# Altium footprint library Keyboard_parts.PcbLib: 52 footprints (part 2 of 4)
Each footprint in its own frame and in the unit in brackets; x right, y up, seen from the top. Pads: shape width x height; smd on the part's side, far side on the other; paste and mask are expansions set on the pad; w line width, h text height; cw(c..) or ccw(c..) is an arc to the next point about the centre after c.
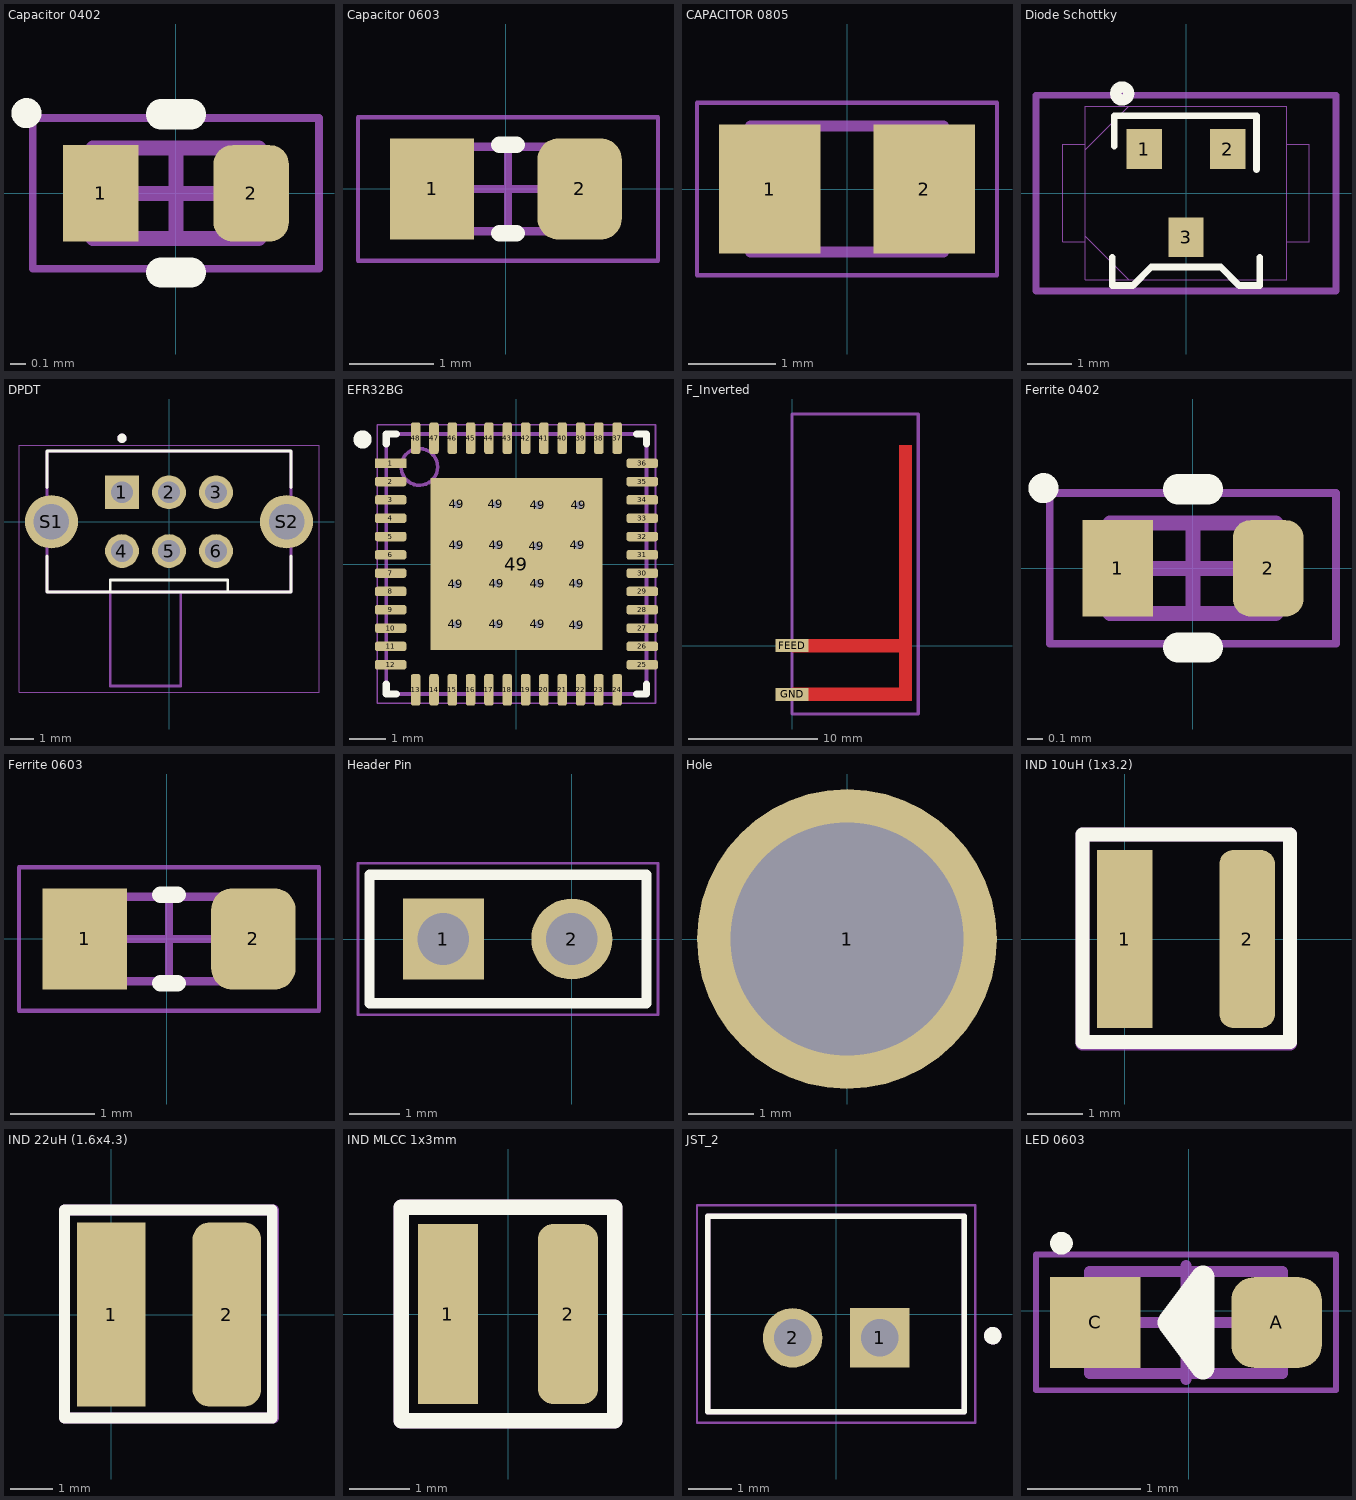
[diagram p1: the footprints below, top view; thin cyan lines are the x and y axes]

## Capacitor 0402 [mm]
height 0.55
pads (2):
  rect 0.5x0.64 smd: 1(-0.5,0)
  rrect50% 0.5x0.64 smd: 2(0.5,0)
Top Overlay:
  circle w0.1: c-0.992,0.532 r0.05
  lines w0.2: -0.1,-0.525 0.1,-0.525 ; -0.1,0.525 0.1,0.525
Mechanical 13:
  lines w0.1: -0.55,-0.3 -0.55,0.3 0.55,0.3 0.55,-0.3 -0.55,-0.3
  text ".Designator" at -0.55,-0.3 h0.4
Mechanical 15:
  lines w0.05: -0.95,-0.5 -0.95,0.5 0.95,0.5 0.95,-0.5 -0.95,-0.5
  lines w0.1: -0.3,0 0.3,0 ; 0,-0.3 0,0.3
3D body "step_temp.STEP": height 0.55, standoff 0, extent -0.5,-0.25 0.5,0.25

## Capacitor 0603 [mm] "Chip Capacitor, 2-Leads, Body 1.60x0.80mm, IPC Medium Density"
height 0.55
pads (2):
  rect 1x1.2 smd: 1(-0.875,0)
  rrect50% 1x1.2 smd: 2(0.875,0)
Top Overlay:
  lines w0.2: -0.075,-0.525 0.125,-0.525 ; -0.075,0.525 0.125,0.525
Mechanical 13:
  lines w0.1: -0.875,-0.5 0.925,-0.5 0.925,0.5 -0.875,0.5 -0.875,-0.5
  text ".Designator" at -0.875,-0.5 h0.4
Mechanical 15:
  lines w0.05: -1.753,-0.85 1.803,-0.85 1.803,0.85 -1.753,0.85 -1.753,-0.85
  lines w0.1: -0.475,0 0.525,0 ; 0.025,-0.5 0.025,0.5
3D body "CAP_0603_1608X10.step": height 1, standoff 0, extent -0.875,-0.5 0.925,0.5

## CAPACITOR 0805 [mm]
pads (2):
  rect 1.16x1.47 smd: 1(-0.88,0) 2(0.88,0)
Mechanical 13:
  lines w0.127: -1.1,-0.72 -1.1,0.72 1.1,0.72 1.1,-0.72 -1.1,-0.72
Mechanical 15:
  lines w0.05: -1.713,-0.983 -1.713,0.983 1.713,0.983 1.713,-0.983 -1.713,-0.983

## Diode Schottky [mm]
pads (3):
  rect 0.8x0.9 smd paste+0: 1(-0.95,1) 2(0.95,1)
  rect 0.8x0.9 smd: 3(0,-1)
Top Overlay:
  circle w0.254: c-1.448,2.261 r0.148
  lines w0.152: -1.676,-1.463 -1.676,-2.095 -1.206,-2.095 -0.787,-1.676 0.787,-1.676 1.206,-2.095 1.676,-2.095 1.676,-1.463 ; -1.626,1.067 -1.626,1.753 1.6,1.753 1.6,0.533
Mechanical 13:
  lines w0.025: -2.286,-0.984 -1.302,-1.968 ; -2.286,0.984 -1.302,1.968 ; -2.794,-1.105 -2.286,-1.105 -2.286,1.105 -2.794,1.105 -2.794,-1.105 ; -2.286,-1.968 -2.286,1.968 2.286,1.968 2.286,-1.968 -2.286,-1.968 ; 2.286,-1.105 2.794,-1.105 2.794,1.105 2.286,1.105 2.286,-1.105
Mechanical 15:
  lines w0.152: -3.404,-2.222 3.404,-2.222 3.404,2.222 -3.404,2.222 -3.404,-2.222
3D body "LSM115JE3_TR13.step": height 2.81, standoff -0.49, extent -2.675,-1.785 2.725,1.835

## DPDT [mm]
height 5
pads (8):
  rect 1.438x1.438 / inner round 1.438 / far side rect 1.438x1.438 hole 0.93: 1(-2,1.25)
  round 1.438 hole 0.93: 2(0,1.25) 3(2,1.25) 4(-2,-1.25) 5(0,-1.25) 6(2,-1.25)
  round 2.265 hole 1.51: S1(-5,0) S2(5,0)
Top Overlay:
  circle w0.2: c-2,3.55 r0.1
  lines w0.127: -5.2,-1.452 -5.2,-3 -2.5,-3 ; -5.2,1.452 -5.2,3 5.2,3 5.2,1.452 ; 5.2,-1.452 5.2,-3 2.5,-3 ; -2.5,-3 -2.5,-2.489 2.5,-2.489 2.5,-3 ; -2.5,-3 2.5,-3
Mechanical 13:
  circle w0.2: c-2,3.55 r0.1
  lines w0.127: -2.5,-3 -2.5,-7 0.5,-7 0.5,-3 ; -2.5,-3 0.5,-3 ; -2.5,-3 -5.2,-3 -5.2,3 5.2,3 5.2,-3 0.5,-3
Mechanical 15:
  lines w0.05: -6.382,-7.25 6.382,-7.25 6.382,3.25 -6.382,3.25 -6.382,-7.25
3D body "step_temp.STEP": height 5, standoff -3, extent -5.15,-7 5.15,3

## EFR32BG [mm] "PQFN, 48-Leads, Body 7.00x7.00mm, Pitch 0.50mm, Thermal Pad 4.70x4.70mm, IPC Medium Density"
height 0.9
pads (65):
  rect 0.86x0.26 smd mask+0.05: 1(-3.435,2.75)
  rrect50% 0.86x0.26 smd mask+0.05: 2(-3.435,2.25) 3(-3.435,1.75) 4(-3.435,1.25) 5(-3.435,0.75) 6(-3.435,0.25) 7(-3.435,-0.25) 8(-3.435,-0.75) 9(-3.435,-1.25) 10(-3.435,-1.75) 11(-3.435,-2.25) 12(-3.435,-2.75) 25(3.435,-2.75) 26(3.435,-2.25) 27(3.435,-1.75) 28(3.435,-1.25) 29(3.435,-0.75) 30(3.435,-0.25) 31(3.435,0.25) 32(3.435,0.75) 33(3.435,1.25) 34(3.435,1.75) 35(3.435,2.25) 36(3.435,2.75)
  rrect50% 0.26x0.86 smd mask+0.05: 13(-2.75,-3.435) 14(-2.25,-3.435) 15(-1.75,-3.435) 16(-1.25,-3.435) 17(-0.75,-3.435) 18(-0.25,-3.435) 19(0.25,-3.435) 20(0.75,-3.435) 21(1.25,-3.435) 22(1.75,-3.435) 23(2.25,-3.435) 24(2.75,-3.435) 37(2.75,3.435) 38(2.25,3.435) 39(1.75,3.435) 40(1.25,3.435) 41(0.75,3.435) 42(0.25,3.435) 43(-0.25,3.435) 44(-0.75,3.435) 45(-1.25,3.435) 46(-1.75,3.435) 47(-2.25,3.435) 48(-2.75,3.435)
  round 0.5 hole 0.2: 49(-1.651,-1.651) 49(-1.651,-0.559) 49(-1.626,0.508) 49(-1.626,1.626) 49(-0.559,1.626) 49(-0.533,-1.651) 49(-0.533,-0.533) 49(-0.533,0.508) 49(0.559,0.483) 49(0.584,-1.651) 49(0.584,-0.533) 49(0.584,1.6) 49(1.651,-1.676) 49(1.651,-0.533) 49(1.676,0.508) 49(1.702,1.6)
  rect 4.7x4.7 smd paste-20 mask+0.05: 49(0,0)
Top Overlay:
  circle w0.25: c-4.2,3.4 r0.125
  lines w0.2: -3.55,-3.28 -3.55,-3.55 -3.28,-3.55 ; -3.55,3.28 -3.55,3.55 -3.28,3.55 ; 3.28,-3.55 3.55,-3.55 3.55,-3.28 ; 3.28,3.55 3.55,3.55 3.55,3.28
Top Paste:
  rectangle: 0.686,-1.473 1.448,-0.762
  rectangle: -0.381,-1.473 0.381,-0.762
  rectangle: -1.473,-1.473 -0.711,-0.762
  rectangle: 0.711,-0.356 1.473,0.356
  rectangle: -0.381,-0.356 0.381,0.356
  rectangle: -1.473,-0.356 -0.711,0.356
  rectangle: 0.711,0.737 1.473,1.448
  rectangle: -0.381,0.737 0.381,1.448
  rectangle: -1.499,0.737 -0.737,1.448
Mechanical 13:
  circle w0.1: c-2.65,2.65 r0.5
  lines w0.1: -3.55,-3.55 3.55,-3.55 3.55,3.55 -3.55,3.55 -3.55,-3.55
  text ".Designator" at -3.396,-3.063 h1
Mechanical 15:
  lines w0.05: -3.8,-3.8 3.8,-3.8 3.8,3.8 -3.8,3.8 -3.8,-3.8
  lines w0.1: -0.5,0 0.5,0 ; 0,-0.5 0,0.5
3D body "PQFN50P700X700X90_HS-49N.step": height 0.9, standoff 0, extent -3.55,-3.55 3.55,3.55

## F_Inverted [mil] "inverted f antenna with 50 ohm impedence matching"
pads (2):
  rect 100x40 smd paste-39.37 mask+4.02: FEED(0,0)
  rect 100x40 smd paste-78.74 mask+4.02: GND(0,-149)
Top Layer:
  region: 0,20 327,20 327,613 366,613 366,-169 0,-169 0,-129 327,-129 327,-20 0,-20
Mechanical 15:
  lines w10: 0,-209 0,-129 0,707 1,708 386,708 386,-209 2,-209

## Ferrite 0402 [mm]
height 0.55
pads (2):
  rect 0.47x0.64 smd: 1(-0.5,0)
  rrect50% 0.47x0.64 smd: 2(0.5,0)
Top Overlay:
  circle w0.1: c-0.992,0.532 r0.05
  lines w0.2: -0.1,-0.525 0.1,-0.525 ; -0.1,0.525 0.1,0.525
Mechanical 13:
  lines w0.1: -0.55,-0.3 -0.55,0.3 0.55,0.3 0.55,-0.3 -0.55,-0.3
  text ".Designator" at -0.55,-0.3 h0.4
Mechanical 15:
  lines w0.05: -0.95,-0.5 -0.95,0.5 0.95,0.5 0.95,-0.5 -0.95,-0.5
  lines w0.1: -0.3,0 0.3,0 ; 0,-0.3 0,0.3
3D body "Chip2PinSM127P600-8N.step": height 0.55, standoff 0, extent -0.55,-0.3 0.55,0.3

## Ferrite 0603 [mm] "EFR32bg13- / RFVDD, PAVDD"
height 0.55
pads (2):
  rect 1x1.2 smd: 1(-0.975,0)
  rrect50% 1x1.2 smd: 2(1.025,0)
Top Overlay:
  lines w0.2: -0.075,-0.525 0.125,-0.525 ; -0.075,0.525 0.125,0.525
Mechanical 13:
  lines w0.1: -0.875,-0.5 -0.875,0.5 0.925,0.5 0.925,-0.5 -0.875,-0.5
  text ".Designator" at -0.875,-0.5 h0.4
Mechanical 15:
  lines w0.05: -1.753,-0.85 -1.753,0.85 1.803,0.85 1.803,-0.85 -1.753,-0.85
  lines w0.1: -0.475,0 0.525,0 ; 0.025,-0.5 0.025,0.5
3D body "CAP_0603_1608X10.step": height 1, standoff 0, extent -0.875,-0.5 0.925,0.5

## Header Pin [mm]
pads (2):
  rect 1.6x1.6 hole 1.02: 1(-2.54,0)
  round 1.6 hole 1.02: 2(0,0)
Top Overlay:
  lines w0.2: -4,-1.27 -4,1.27 1.473,1.27 1.473,-1.27 -4,-1.27
Mechanical 13:
  lines w0.1: -4,-1.27 -4,1.27 1.473,1.27 1.473,-1.27 -4,-1.27
  text ".Designator" at -1.524,-0.635 h1.3
Mechanical 15:
  lines w0.05: -4.225,-1.495 -4.225,1.495 1.702,1.495 1.702,-1.495 -4.225,-1.495
  lines w0.1: -0.5,0 0.5,0 ; 0,-0.5 0,0.5

## Hole [mil]
pads (1):
  round 180 hole 140: 1(0,0)

## IND 10uH (1x3.2) [mm]
pads (2):
  rect 1x3.2 smd: 1(0,0)
  rrect50% 1x3.2 smd: 2(2.2,0)
Top Overlay:
  lines w0.254: -0.762,-1.854 -0.762,1.88 2.972,1.88 2.972,-1.854 -0.762,-1.854
Mechanical 13:
  lines w0.254: -0.762,-1.88 2.972,-1.88 2.972,1.88 -0.762,1.88 -0.762,-1.88
  text ".Designator" at -0.524,-1.016 h1.52
3D body "744029001_Download_STP_WE-TPC-2813_rev1.stp": height 0.24, standoff -0.96, extent -0.272,-1.441 2.508,1.339

## IND 22uH (1.6x4.3) [mm]
pads (2):
  rect 1.6x4.3 smd: 1(0,0)
  rrect50% 1.6x4.3 smd: 2(2.7,0)
Top Overlay:
  lines w0.254: -1.092,-2.413 -1.092,2.438 3.759,2.438 3.759,-2.413 -1.092,-2.413
Mechanical 13:
  lines w0.254: -1.092,-2.413 3.785,-2.413 3.785,2.438 -1.092,2.438 -1.092,-2.413
  text ".Designator" at -0.838,-1.651 h1.52
3D body "744031001_Download_STP_WE-TPC-3816_rev1.stp": height 1.66, standoff 0.01, extent -0.579,-1.9 3.221,1.9

## IND MLCC 1x3mm [mm] "2.2 µH Shielded Drum Core, Wirewound Inductor 1.8 A 66mOhm Max Nonstandard"
pads (2):
  rect 1x3 smd: 1(-1,0)
  rrect50% 1x3 smd: 2(1,0)
Top Overlay:
  lines w0.254: -1.778,-1.778 -1.778,1.524 -1.778,1.778 1.778,1.778 1.778,-1.778 -1.778,-1.778
Mechanical 13:
  lines w0.254: -1.778,-1.778 -1.778,1.778 1.778,1.778 1.778,-1.778 -1.778,-1.778
  text ".Designator" at -1.524,-1.016 h1.52
3D body "744029001_Download_STP_WE-TPC-2813_rev1.stp": height 0.24, standoff -0.96, extent -1.39,-1.39 1.39,1.39

## JST_2 [mm]
pads (2):
  rect 1.368x1.368 / inner round 1.368 / far side rect 1.368x1.368 hole 0.86: 1(1,-0.55)
  round 1.368 hole 0.86: 2(-1,-0.55)
Top Overlay:
  circle w0.2: c3.6,-0.5 r0.1
  lines w0.127: -2.95,-2.25 -2.95,2.25 2.95,2.25 2.95,-2.25 -2.95,-2.25
Mechanical 1:
  text ".Designator" at -2.433,1.066 h0.5
Mechanical 13:
  circle w0.2: c3.6,-0.5 r0.1
  lines w0.127: -2.95,-2.25 2.95,-2.25 2.95,2.25 -2.95,2.25 -2.95,-2.25
Mechanical 15:
  lines w0.05: -3.2,-2.5 3.2,-2.5 3.2,2.5 -3.2,2.5 -3.2,-2.5
3D body "B2B-PH-K-S(LF)(SN)--3DModel-STEP-56544.STEP": height 6.05, standoff -3.35, extent -2.95,-2.25 2.95,2.25

## LED 0603 [mm] "SODFL, 2-Leads, Body 0.80x1.80mm, IPC Medium Density"
pads (2):
  rrect50% 0.8x0.8 smd: A(0.775,-0.102)
  rect 0.8x0.8 smd: C(-0.825,-0.102)
Top Overlay:
  circle w0.1: c-1.125,0.598 r0.05
  lines w0.2: -0.175,-0.102 0.025,-0.102
  lines w0.205: -0.175,-0.102 0.125,-0.502 0.125,0.298 -0.175,-0.102
Mechanical 13:
  lines w0.1: -0.875,-0.552 -0.875,0.348 0.825,0.348 0.825,-0.552 -0.875,-0.552
Mechanical 15:
  lines w0.05: -1.35,-0.702 -1.35,0.498 1.3,0.498 1.3,-0.702 -1.35,-0.702
  lines w0.1: -0.525,-0.102 0.475,-0.102 ; -0.025,-0.602 -0.025,0.398
3D body "LED_0603_WURTH_WL-SMCW_lens.step": height 0.71, standoff 0.31, extent -0.575,-0.502 0.525,0.298
3D body "LED_0603_WURTH_WL-SMCW_base.step": height 0.65, standoff 0.01, extent -0.825,-0.501 0.775,0.298